# Altium footprint library mw.PcbLib: 113 footprints (part 8 of 8)
Each footprint in its own frame and in the unit in brackets; x right, y up, seen from the top. Pads: shape width x height; smd on the part's side, far side on the other; paste and mask are expansions set on the pad; w line width, h text height; cw(c..) or ccw(c..) is an arc to the next point about the centre after c.
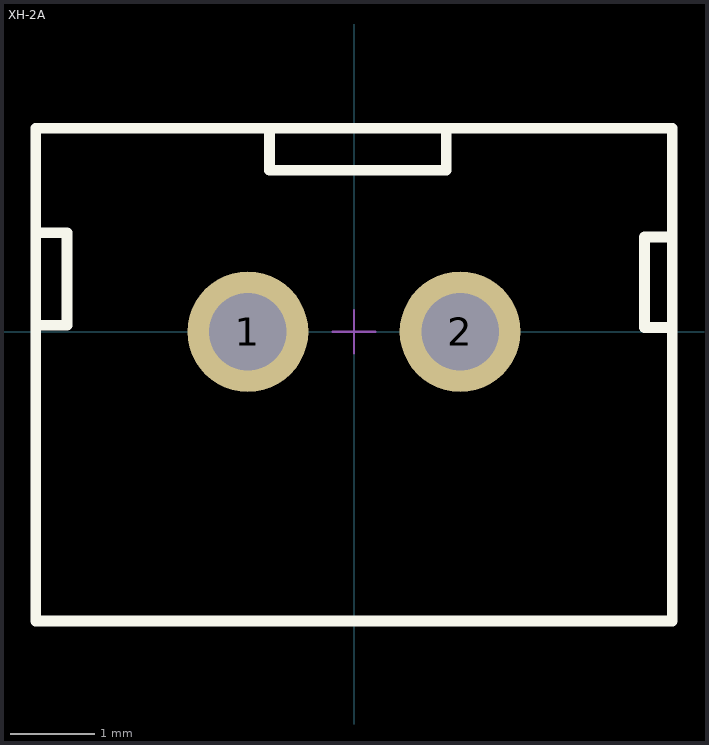
[diagram p7: the footprint, top view; thin cyan lines are the x and y axes]

## XH-2A [mil] "XH2.54接线端子2P"
pads (2):
  round 56 hole 36: 1(-49.22,0) 2(49.22,0)
Top Overlay:
  lines w5: -147.22,3 -133.22,3 -133.22,46 -146.22,46 ; -39.22,93 -39.22,75 42.78,75 42.78,94 ; 145.78,2 134.78,2 134.78,44 146.78,44 ; -147.65,-134.17 -147.65,94.49 147.63,94.49 147.63,-134.17 -147.65,-134.17
Mechanical 15:
  lines w1: -10,0 10,0 ; 0,-10 0,10 ; -147.31,-133.09 -147.31,95 147.31,95 147.31,-133.09 -147.31,-133.09
3D body "sh2.5-2pin.STEP": height 275.59, standoff -133.86, extent -145.67,-134.17 145.67,94.17